# Altium schematic symbol library TI Power Management Shunt Voltage Reference.SchLib: 1526 symbols (part 4 of 18) (continued)
## LM4040C30QDBZTG4
designator U?
Precision Micropower Shunt Voltage Reference, 0.5% accuracy, 3 V, 15 ppm / degC, 15 mA, -40 to 125 degC, 3-pin SOT-23 (DBZ), Green (RoHS & no Sb/Br); Manufacturer: Texas Instruments; PartNumber: LM4040C30QDBZTG4; Initial Accuracy @ 25/deg C(%): 0.5; Iout/Iz(Max)(mA): 15; Min Iz for Regulation(uA): 60; Rating: Catalog; Temp Coeff(Max)(ppm/ degree C): 100; VO(V): 3; DatasheetVersion: SLOS456K; PackageVersion: 4203227/B; PackageReference: DBZ3; PackageDescription: 3-Pin Plastic Small Outline, Body 2.92 x 1.3 mm, Pitch 0.95 mm; Supplier 1: Digi-Key; Supplier Part Number 1: LM4040C30QDBZTG4-ND; Supplier 2: Mouser; Supplier Part Number 2: 595-LM4040C30QDBZTG4; Eco-Plan: Green (RoHS & no Sb/Br); SubFamily: Shunt Voltage Reference; Temp Coeff(Typ)(ppm/ degree C): 15; Mounting Technology: Surface Mount; Code_JEDEC: TO-236; ComponentLink1Description: Manufacturer URL; ComponentLink1URL: http://www.ti.com/; ComponentLink2Description: Datasheet; ComponentLink2URL: http://www.ti.com/general/docs/lit/getliterature.tsp?genericPartNumber=LM4040C30&fileType=pdf; ComponentLink3Description: Package Specification; ComponentLink3URL: http://www.ti.com/litv/pdf/mpds108a
footprint TI-DBZ3_N (SOT23, 3-Leads, Body 2.92x1.3 mm, Pitch 0.95 mm, IPC Medium Density)
pins: 1 CATHODE, 2 ANODE, 3 NC

## LM4040C41IDBZR
designator U?
Precision Micropower Shunt Voltage Reference, 0.5% accuracy, 4.096 V, 15 ppm / degC, 15 mA, -40 to 85 degC, 3-pin SOT-23 (DBZ), Green (RoHS & no Sb/Br); Manufacturer: Texas Instruments; PartNumber: LM4040C41IDBZR; Initial Accuracy @ 25/deg C(%): 0.5; Iout/Iz(Max)(mA): 15; Min Iz for Regulation(uA): 68; Rating: Catalog; Temp Coeff(Max)(ppm/ degree C): 100; VO(V): 4.096; DatasheetVersion: SLOS456K; PackageVersion: 4203227/B; PackageReference: DBZ3; PackageDescription: 3-Pin Plastic Small Outline, Body 2.92 x 1.3 mm, Pitch 0.95 mm; Supplier 1: Digi-Key; Supplier Part Number 1: 296-20890-2-ND; Supplier 2: Digi-Key; Supplier Part Number 2: 296-20890-1-ND; Supplier 3: Digi-Key; Supplier Part Number 3: 296-20890-6-ND; Supplier 4: Farnell; Supplier Part Number 4: 1575265; Supplier 5: Newark; Supplier Part Number 5: 66K2456; Supplier 6: Mouser; Supplier Part Number 6: 595-LM4040C41IDBZR; Eco-Plan: Green (RoHS & no Sb/Br); SubFamily: Shunt Voltage Reference; Temp Coeff(Typ)(ppm/ degree C): 15; Mounting Technology: Surface Mount; Code_JEDEC: TO-236; ComponentLink1Description: Manufacturer URL; ComponentLink1URL: http://www.ti.com/; ComponentLink2Description: Datasheet; ComponentLink2URL: http://www.ti.com/general/docs/lit/getliterature.tsp?genericPartNumber=LM4040C41&fileType=pdf; ComponentLink3Description: Package Specification; ComponentLink3URL: http://www.ti.com/litv/pdf/mpds108a
footprint TI-DBZ3_N (SOT23, 3-Leads, Body 2.92x1.3 mm, Pitch 0.95 mm, IPC Medium Density)
pins: 1 CATHODE, 2 ANODE, 3 NC "No internal connection"

## LM4040C41IDBZRG4
designator U?
Precision Micropower Shunt Voltage Reference, 0.5% accuracy, 4.096 V, 15 ppm / degC, 15 mA, -40 to 85 degC, 3-pin SOT-23 (DBZ), Green (RoHS & no Sb/Br); Manufacturer: Texas Instruments; PartNumber: LM4040C41IDBZRG4; Initial Accuracy @ 25/deg C(%): 0.5; Iout/Iz(Max)(mA): 15; Min Iz for Regulation(uA): 68; Rating: Catalog; Temp Coeff(Max)(ppm/ degree C): 100; VO(V): 4.096; DatasheetVersion: SLOS456K; PackageVersion: 4203227/B; PackageReference: DBZ3; PackageDescription: 3-Pin Plastic Small Outline, Body 2.92 x 1.3 mm, Pitch 0.95 mm; Supplier 1: Digi-Key; Supplier Part Number 1: LM4040C41IDBZRG4-ND; Supplier 2: Mouser; Supplier Part Number 2: 595-LM4040C41IDBZRG4; Eco-Plan: Green (RoHS & no Sb/Br); SubFamily: Shunt Voltage Reference; Temp Coeff(Typ)(ppm/ degree C): 15; Mounting Technology: Surface Mount; Code_JEDEC: TO-236; ComponentLink1Description: Manufacturer URL; ComponentLink1URL: http://www.ti.com/; ComponentLink2Description: Datasheet; ComponentLink2URL: http://www.ti.com/general/docs/lit/getliterature.tsp?genericPartNumber=LM4040C41&fileType=pdf; ComponentLink3Description: Package Specification; ComponentLink3URL: http://www.ti.com/litv/pdf/mpds108a
footprint TI-DBZ3_N (SOT23, 3-Leads, Body 2.92x1.3 mm, Pitch 0.95 mm, IPC Medium Density)
pins: 1 CATHODE, 2 ANODE, 3 NC "No internal connection"

## LM4040C41IDBZT
designator U?
Precision Micropower Shunt Voltage Reference, 0.5% accuracy, 4.096 V, 15 ppm / degC, 15 mA, -40 to 85 degC, 3-pin SOT-23 (DBZ), Green (RoHS & no Sb/Br); Manufacturer: Texas Instruments; PartNumber: LM4040C41IDBZT; Initial Accuracy @ 25/deg C(%): 0.5; Iout/Iz(Max)(mA): 15; Min Iz for Regulation(uA): 68; Rating: Catalog; Temp Coeff(Max)(ppm/ degree C): 100; VO(V): 4.096; DatasheetVersion: SLOS456K; PackageVersion: 4203227/B; PackageReference: DBZ3; PackageDescription: 3-Pin Plastic Small Outline, Body 2.92 x 1.3 mm, Pitch 0.95 mm; Supplier 1: Digi-Key; Supplier Part Number 1: 296-32117-2-ND; Supplier 2: Digi-Key; Supplier Part Number 2: 296-32117-1-ND; Supplier 3: Digi-Key; Supplier Part Number 3: 296-32117-6-ND; Supplier 4: Newark; Supplier Part Number 4: 66K2457; Supplier 5: Mouser; Supplier Part Number 5: 595-LM4040C41IDBZT; Eco-Plan: Green (RoHS & no Sb/Br); SubFamily: Shunt Voltage Reference; Temp Coeff(Typ)(ppm/ degree C): 15; Mounting Technology: Surface Mount; Code_JEDEC: TO-236; ComponentLink1Description: Manufacturer URL; ComponentLink1URL: http://www.ti.com/; ComponentLink2Description: Datasheet; ComponentLink2URL: http://www.ti.com/general/docs/lit/getliterature.tsp?genericPartNumber=LM4040C41&fileType=pdf; ComponentLink3Description: Package Specification; ComponentLink3URL: http://www.ti.com/litv/pdf/mpds108a
footprint TI-DBZ3_N (SOT23, 3-Leads, Body 2.92x1.3 mm, Pitch 0.95 mm, IPC Medium Density)
pins: 1 CATHODE, 2 ANODE, 3 NC "No internal connection"

## LM4040C41IDBZTG4
designator U?
Precision Micropower Shunt Voltage Reference, 0.5% accuracy, 4.096 V, 15 ppm / degC, 15 mA, -40 to 85 degC, 3-pin SOT-23 (DBZ), Green (RoHS & no Sb/Br); Manufacturer: Texas Instruments; PartNumber: LM4040C41IDBZTG4; Initial Accuracy @ 25/deg C(%): 0.5; Iout/Iz(Max)(mA): 15; Min Iz for Regulation(uA): 68; Rating: Catalog; Temp Coeff(Max)(ppm/ degree C): 100; VO(V): 4.096; DatasheetVersion: SLOS456K; PackageVersion: 4203227/B; PackageReference: DBZ3; PackageDescription: 3-Pin Plastic Small Outline, Body 2.92 x 1.3 mm, Pitch 0.95 mm; Supplier 1: Digi-Key; Supplier Part Number 1: LM4040C41IDBZTG4-ND; Supplier 2: Newark; Supplier Part Number 2: 67K8098; Supplier 3: Mouser; Supplier Part Number 3: 595-LM4040C41IDBZTG4; Eco-Plan: Green (RoHS & no Sb/Br); SubFamily: Shunt Voltage Reference; Temp Coeff(Typ)(ppm/ degree C): 15; Mounting Technology: Surface Mount; Code_JEDEC: TO-236; ComponentLink1Description: Manufacturer URL; ComponentLink1URL: http://www.ti.com/; ComponentLink2Description: Datasheet; ComponentLink2URL: http://www.ti.com/general/docs/lit/getliterature.tsp?genericPartNumber=LM4040C41&fileType=pdf; ComponentLink3Description: Package Specification; ComponentLink3URL: http://www.ti.com/litv/pdf/mpds108a
footprint TI-DBZ3_N (SOT23, 3-Leads, Body 2.92x1.3 mm, Pitch 0.95 mm, IPC Medium Density)
pins: 1 CATHODE, 2 ANODE, 3 NC "No internal connection"

## LM4040C41IDCKR
designator U?
Precision Micropower Shunt Voltage Reference, 0.5% accuracy, 4.096 V, 15 ppm / degC, 15 mA, -40 to 85 degC, 5-pin SC70 (DCK), Green (RoHS & no Sb/Br); Manufacturer: Texas Instruments; PartNumber: LM4040C41IDCKR; Initial Accuracy @ 25/deg C(%): 0.5; Iout/Iz(Max)(mA): 15; Min Iz for Regulation(uA): 68; Rating: Catalog; Temp Coeff(Max)(ppm/ degree C): 100; VO(V): 4.096; DatasheetVersion: SLOS456K; PackageReference: DCK5; PackageDescription: 5-Pin Plastic Small-Outline Package, 2 x 1.3 mm Body, 0.65 mm Pitch, 2.1 mm Lead Span; Supplier 1: Digi-Key; Supplier Part Number 1: 296-20891-2-ND; Supplier 2: Digi-Key; Supplier Part Number 2: 296-20891-1-ND; Supplier 3: Digi-Key; Supplier Part Number 3: 296-20891-6-ND; Supplier 4: Newark; Supplier Part Number 4: 66K2458; Supplier 5: Mouser; Supplier Part Number 5: 595-LM4040C41IDCKR; Eco-Plan: Green (RoHS & no Sb/Br); SubFamily: Shunt Voltage Reference; Temp Coeff(Typ)(ppm/ degree C): 15; Mounting Technology: Surface Mount; Code_JEDEC: MO-203; ComponentLink1Description: Manufacturer URL; ComponentLink1URL: http://www.ti.com/; ComponentLink2Description: Datasheet; ComponentLink2URL: http://www.ti.com/general/docs/lit/getliterature.tsp?genericPartNumber=LM4040C41&fileType=pdf; ComponentLink3Description: Package Specification; ComponentLink3URL: http://www.ti.com/litv/pdf/mpds025f
footprint TI-DCK5_N (SOT353, 5-Leads, Body 2x1.3mm, Pitch 0.65mm, Lead Span 2.1mm, IPC Medium Density)
part A pins: 1 ANODE, 3 CATHODE
part B pins: 2 NC, 4 NC, 5 NC

## LM4040C41IDCKRE4
designator U?
Precision Micropower Shunt Voltage Reference, 0.5% accuracy, 4.096 V, 15 ppm / degC, 15 mA, -40 to 85 degC, 5-pin SC70 (DCK), Green (RoHS & no Sb/Br); Manufacturer: Texas Instruments; PartNumber: LM4040C41IDCKRE4; Initial Accuracy @ 25/deg C(%): 0.5; Iout/Iz(Max)(mA): 15; Min Iz for Regulation(uA): 68; Rating: Catalog; Temp Coeff(Max)(ppm/ degree C): 100; VO(V): 4.096; DatasheetVersion: SLOS456K; PackageReference: DCK5; PackageDescription: 5-Pin Plastic Small-Outline Package, 2 x 1.3 mm Body, 0.65 mm Pitch, 2.1 mm Lead Span; Supplier 1: Digi-Key; Supplier Part Number 1: LM4040C41IDCKRE4-ND; Supplier 2: Mouser; Supplier Part Number 2: 595-LM4040C41IDCKRE4; Eco-Plan: Green (RoHS & no Sb/Br); SubFamily: Shunt Voltage Reference; Temp Coeff(Typ)(ppm/ degree C): 15; Mounting Technology: Surface Mount; Code_JEDEC: MO-203; ComponentLink1Description: Manufacturer URL; ComponentLink1URL: http://www.ti.com/; ComponentLink2Description: Datasheet; ComponentLink2URL: http://www.ti.com/general/docs/lit/getliterature.tsp?genericPartNumber=LM4040C41&fileType=pdf; ComponentLink3Description: Package Specification; ComponentLink3URL: http://www.ti.com/litv/pdf/mpds025f
footprint TI-DCK5_N (SOT353, 5-Leads, Body 2x1.3mm, Pitch 0.65mm, Lead Span 2.1mm, IPC Medium Density)
part A pins: 1 ANODE, 3 CATHODE
part B pins: 2 NC, 4 NC, 5 NC

## LM4040C41IDCKRG4
designator U?
Precision Micropower Shunt Voltage Reference, 0.5% accuracy, 4.096 V, 15 ppm / degC, 15 mA, -40 to 85 degC, 5-pin SC70 (DCK), Green (RoHS & no Sb/Br); Manufacturer: Texas Instruments; PartNumber: LM4040C41IDCKRG4; Initial Accuracy @ 25/deg C(%): 0.5; Iout/Iz(Max)(mA): 15; Min Iz for Regulation(uA): 68; Rating: Catalog; Temp Coeff(Max)(ppm/ degree C): 100; VO(V): 4.096; DatasheetVersion: SLOS456K; PackageReference: DCK5; PackageDescription: 5-Pin Plastic Small-Outline Package, 2 x 1.3 mm Body, 0.65 mm Pitch, 2.1 mm Lead Span; Supplier 1: Digi-Key; Supplier Part Number 1: LM4040C41IDCKRG4-ND; Supplier 2: Newark; Supplier Part Number 2: 41M3446; Supplier 3: Mouser; Supplier Part Number 3: 595-LM4040C41IDCKRG4; Eco-Plan: Green (RoHS & no Sb/Br); SubFamily: Shunt Voltage Reference; Temp Coeff(Typ)(ppm/ degree C): 15; Mounting Technology: Surface Mount; Code_JEDEC: MO-203; ComponentLink1Description: Manufacturer URL; ComponentLink1URL: http://www.ti.com/; ComponentLink2Description: Datasheet; ComponentLink2URL: http://www.ti.com/general/docs/lit/getliterature.tsp?genericPartNumber=LM4040C41&fileType=pdf; ComponentLink3Description: Package Specification; ComponentLink3URL: http://www.ti.com/litv/pdf/mpds025f
footprint TI-DCK5_N (SOT353, 5-Leads, Body 2x1.3mm, Pitch 0.65mm, Lead Span 2.1mm, IPC Medium Density)
part A pins: 1 ANODE, 3 CATHODE
part B pins: 2 NC, 4 NC, 5 NC

## LM4040C41ILP
designator U?
Precision Micropower Shunt Voltage Reference, 0.5% accuracy, 4.096 V, 15 ppm / degC, 15 mA, -40 to 85 degC, 3-pin TO-92 (LP), Pb-Free (RoHS); Manufacturer: Texas Instruments; PartNumber: LM4040C41ILP; Initial Accuracy @ 25/deg C(%): 0.5; Iout/Iz(Max)(mA): 15; Min Iz for Regulation(uA): 68; Rating: Catalog; Temp Coeff(Max)(ppm/ degree C): 100; VO(V): 4.096; DatasheetVersion: SLOS456K; PackageVersion: 4040001-2/C; PackageReference: LP3; PackageDescription: Plastic Cylindrical Package, Formed Lead Option (TO-92); Supplier 1: Digi-Key; Supplier Part Number 1: 296-31367-ND; Supplier 2: Farnell; Supplier Part Number 2: 1755114; Supplier 3: Newark; Supplier Part Number 3: 50M8848; Supplier 4: Mouser; Supplier Part Number 4: 595-LM4040C41ILP; Eco-Plan: Pb-Free (RoHS); SubFamily: Shunt Voltage Reference; Temp Coeff(Typ)(ppm/ degree C): 15; Mounting Technology: Through Hole; Code_JEDEC: TO-226; ComponentLink1Description: Manufacturer URL; ComponentLink1URL: http://www.ti.com/; ComponentLink2Description: Datasheet; ComponentLink2URL: http://www.ti.com/general/docs/lit/getliterature.tsp?genericPartNumber=LM4040C41&fileType=pdf; ComponentLink3Description: Package Specification; ComponentLink3URL: http://www.ti.com/litv/pdf/msot002a
footprint TI-LP3 (TO, Flat Index; 3 In-Line, Formed Axial Leads; Body Dia. 4.8mm; Leads 0.56 x 0.41 mm (max))
pins: 1 NC, 2 CATHODE, 3 ANODE

## LM4040C41ILPE3
designator U?
Precision Micropower Shunt Voltage Reference, 0.5% accuracy, 15 ppm / degC, 15 mA, -40 to 85 degC, 3-pin TO-92 (LP), Pb-Free (RoHS); Manufacturer: Texas Instruments; PartNumber: LM4040C41ILPE3; Initial Accuracy @ 25/deg C(%): 0.5; Iout/Iz(Max)(mA): 15; Min Iz for Regulation(uA): 68; Rating: Catalog; Temp Coeff(Max)(ppm/ degree C): 100; VO(V): 4.096; DatasheetVersion: SLOS456K; PackageVersion: 4040001-2/C; PackageReference: LP3; PackageDescription: Plastic Cylindrical Package, Formed Lead Option (TO-92); Supplier 1: Digi-Key; Supplier Part Number 1: LM4040C41ILPE3-ND; Supplier 2: Newark; Supplier Part Number 2: 65M1426; Supplier 3: Mouser; Supplier Part Number 3: 595-LM4040C41ILPE3; Eco-Plan: Pb-Free (RoHS); SubFamily: Shunt Voltage Reference; Temp Coeff(Typ)(ppm/ degree C): 15; Mounting Technology: Through Hole; Code_JEDEC: TO-226; ComponentLink1Description: Manufacturer URL; ComponentLink1URL: http://www.ti.com/; ComponentLink2Description: Datasheet; ComponentLink2URL: http://www.ti.com/general/docs/lit/getliterature.tsp?genericPartNumber=LM4040C41&fileType=pdf; ComponentLink3Description: Package Specification; ComponentLink3URL: http://www.ti.com/litv/pdf/msot002a
footprint TI-LP3 (TO, Flat Index; 3 In-Line, Formed Axial Leads; Body Dia. 4.8mm; Leads 0.56 x 0.41 mm (max))
pins: 1 NC, 2 CATHODE, 3 ANODE

## LM4040C41ILPR
designator U?
Precision Micropower Shunt Voltage Reference, 0.5% accuracy, 4.096 V, 15 ppm / degC, 15 mA, -40 to 85 degC, 3-pin TO-92 (LP), Pb-Free (RoHS); Manufacturer: Texas Instruments; PartNumber: LM4040C41ILPR; Initial Accuracy @ 25/deg C(%): 0.5; Iout/Iz(Max)(mA): 15; Min Iz for Regulation(uA): 68; Rating: Catalog; Temp Coeff(Max)(ppm/ degree C): 100; VO(V): 4.096; DatasheetVersion: SLOS456K; PackageVersion: 4040001-2/C; PackageReference: LP3; PackageDescription: Plastic Cylindrical Package, Formed Lead Option (TO-92); Supplier 1: Digi-Key; Supplier Part Number 1: 296-22165-3-ND; Supplier 2: Digi-Key; Supplier Part Number 2: 296-22165-1-ND; Supplier 3: Newark; Supplier Part Number 3: 50M8849; Supplier 4: Mouser; Supplier Part Number 4: 595-LM4040C41ILPR; Eco-Plan: Pb-Free (RoHS); SubFamily: Shunt Voltage Reference; Temp Coeff(Typ)(ppm/ degree C): 15; Mounting Technology: Through Hole; Code_JEDEC: TO-226; ComponentLink1Description: Manufacturer URL; ComponentLink1URL: http://www.ti.com/; ComponentLink2Description: Datasheet; ComponentLink2URL: http://www.ti.com/general/docs/lit/getliterature.tsp?genericPartNumber=LM4040C41&fileType=pdf; ComponentLink3Description: Package Specification; ComponentLink3URL: http://www.ti.com/litv/pdf/msot002a
footprint TI-LP3 (TO, Flat Index; 3 In-Line, Formed Axial Leads; Body Dia. 4.8mm; Leads 0.56 x 0.41 mm (max))
pins: 1 NC, 2 CATHODE, 3 ANODE

## LM4040C41ILPRE3
designator U?
Precision Micropower Shunt Voltage Reference, 0.5% accuracy, 4.096 V, 15 ppm / degC, 15 mA, -40 to 85 degC, 3-pin TO-92 (LP), Pb-Free (RoHS); Manufacturer: Texas Instruments; PartNumber: LM4040C41ILPRE3; Initial Accuracy @ 25/deg C(%): 0.5; Iout/Iz(Max)(mA): 15; Min Iz for Regulation(uA): 68; Rating: Catalog; Temp Coeff(Max)(ppm/ degree C): 100; VO(V): 4.096; DatasheetVersion: SLOS456K; PackageVersion: 4040001-2/C; PackageReference: LP3; PackageDescription: Plastic Cylindrical Package, Formed Lead Option (TO-92); Supplier 1: Digi-Key; Supplier Part Number 1: LM4040C41ILPRE3-ND; Supplier 2: Newark; Supplier Part Number 2: 65M1427; Supplier 3: Mouser; Supplier Part Number 3: 595-LM4040C41ILPRE3; Eco-Plan: Pb-Free (RoHS); SubFamily: Shunt Voltage Reference; Temp Coeff(Typ)(ppm/ degree C): 15; Mounting Technology: Through Hole; Code_JEDEC: TO-226; ComponentLink1Description: Manufacturer URL; ComponentLink1URL: http://www.ti.com/; ComponentLink2Description: Datasheet; ComponentLink2URL: http://www.ti.com/general/docs/lit/getliterature.tsp?genericPartNumber=LM4040C41&fileType=pdf; ComponentLink3Description: Package Specification; ComponentLink3URL: http://www.ti.com/litv/pdf/msot002a; ComponentLink4Description: URL Link1; ComponentLink4URL: Samples URL:http://www.ti.com/product/lm4040c41
footprint TI-LP3 (TO, Flat Index; 3 In-Line, Formed Axial Leads; Body Dia. 4.8mm; Leads 0.56 x 0.41 mm (max))
pins: 1 NC, 2 CATHODE, 3 ANODE

## LM4040C50IDBZR
designator U?
Precision Micropower Shunt Voltage Reference, 0.5% accuracy, 5 V, 15 ppm / degC, 15 mA, -40 to 85 degC, 3-pin SOT-23 (DBZ), Green (RoHS & no Sb/Br); Manufacturer: Texas Instruments; PartNumber: LM4040C50IDBZR; Initial Accuracy @ 25/deg C(%): 0.5; Iout/Iz(Max)(mA): 15; Min Iz for Regulation(uA): 74; Rating: Catalog; Temp Coeff(Max)(ppm/ degree C): 100; VO(V): 5; DatasheetVersion: SLOS456K; PackageVersion: 4203227/B; PackageReference: DBZ3; PackageDescription: 3-Pin Plastic Small Outline, Body 2.92 x 1.3 mm, Pitch 0.95 mm; Supplier 1: Digi-Key; Supplier Part Number 1: 296-20892-2-ND; Supplier 2: Digi-Key; Supplier Part Number 2: 296-20892-1-ND; Supplier 3: Digi-Key; Supplier Part Number 3: 296-20892-6-ND; Supplier 4: Farnell; Supplier Part Number 4: 2119188; Supplier 5: Newark; Supplier Part Number 5: 43K3362; Supplier 6: Mouser; Supplier Part Number 6: 595-LM4040C50IDBZR; Eco-Plan: Green (RoHS & no Sb/Br); SubFamily: Shunt Voltage Reference; Temp Coeff(Typ)(ppm/ degree C): 15; Mounting Technology: Surface Mount; Code_JEDEC: TO-236; ComponentLink1Description: Manufacturer URL; ComponentLink1URL: http://www.ti.com/; ComponentLink2Description: Datasheet; ComponentLink2URL: http://www.ti.com/general/docs/lit/getliterature.tsp?genericPartNumber=LM4040C50&fileType=pdf; ComponentLink3Description: Package Specification; ComponentLink3URL: http://www.ti.com/litv/pdf/mpds108a
footprint TI-DBZ3_N (SOT23, 3-Leads, Body 2.92x1.3 mm, Pitch 0.95 mm, IPC Medium Density)
pins: 1 CATHODE, 2 ANODE, 3 NC

## LM4040C50IDBZRG4
designator U?
Precision Micropower Shunt Voltage Reference, 0.5% accuracy, 5 V, 15 ppm / degC, 15 mA, -40 to 85 degC, 3-pin SOT-23 (DBZ), Green (RoHS & no Sb/Br); Manufacturer: Texas Instruments; PartNumber: LM4040C50IDBZRG4; Initial Accuracy @ 25/deg C(%): 0.5; Iout/Iz(Max)(mA): 15; Min Iz for Regulation(uA): 74; Rating: Catalog; Temp Coeff(Max)(ppm/ degree C): 100; VO(V): 5; DatasheetVersion: SLOS456K; PackageVersion: 4203227/B; PackageReference: DBZ3; PackageDescription: 3-Pin Plastic Small Outline, Body 2.92 x 1.3 mm, Pitch 0.95 mm; Supplier 1: Digi-Key; Supplier Part Number 1: LM4040C50IDBZRG4-ND; Supplier 2: Newark; Supplier Part Number 2: 52K5742; Supplier 3: Mouser; Supplier Part Number 3: 595-LM4040C50IDBZRG4; Eco-Plan: Green (RoHS & no Sb/Br); SubFamily: Shunt Voltage Reference; Temp Coeff(Typ)(ppm/ degree C): 15; Mounting Technology: Surface Mount; Code_JEDEC: TO-236; ComponentLink1Description: Manufacturer URL; ComponentLink1URL: http://www.ti.com/; ComponentLink2Description: Datasheet; ComponentLink2URL: http://www.ti.com/general/docs/lit/getliterature.tsp?genericPartNumber=LM4040C50&fileType=pdf; ComponentLink3Description: Package Specification; ComponentLink3URL: http://www.ti.com/litv/pdf/mpds108a
footprint TI-DBZ3_N (SOT23, 3-Leads, Body 2.92x1.3 mm, Pitch 0.95 mm, IPC Medium Density)
pins: 1 CATHODE, 2 ANODE, 3 NC

## LM4040C50IDBZT
designator U?
Precision Micropower Shunt Voltage Reference, 0.5% accuracy, 5 V, 15 ppm / degC, 15 mA, -40 to 85 degC, 3-pin SOT-23 (DBZ), Green (RoHS & no Sb/Br); Manufacturer: Texas Instruments; PartNumber: LM4040C50IDBZT; Initial Accuracy @ 25/deg C(%): 0.5; Iout/Iz(Max)(mA): 15; Min Iz for Regulation(uA): 74; Rating: Catalog; Temp Coeff(Max)(ppm/ degree C): 100; VO(V): 5; DatasheetVersion: SLOS456K; PackageVersion: 4203227/B; PackageReference: DBZ3; PackageDescription: 3-Pin Plastic Small Outline, Body 2.92 x 1.3 mm, Pitch 0.95 mm; Supplier 1: Digi-Key; Supplier Part Number 1: 296-27987-2-ND; Supplier 2: Digi-Key; Supplier Part Number 2: 296-27987-1-ND; Supplier 3: Digi-Key; Supplier Part Number 3: 296-27987-6-ND; Supplier 4: Newark; Supplier Part Number 4: 43K3363; Supplier 5: Mouser; Supplier Part Number 5: 595-LM4040C50IDBZT; Eco-Plan: Green (RoHS & no Sb/Br); SubFamily: Shunt Voltage Reference; Temp Coeff(Typ)(ppm/ degree C): 15; Mounting Technology: Surface Mount; Code_JEDEC: TO-236; ComponentLink1Description: Manufacturer URL; ComponentLink1URL: http://www.ti.com/; ComponentLink2Description: Datasheet; ComponentLink2URL: http://www.ti.com/general/docs/lit/getliterature.tsp?genericPartNumber=LM4040C50&fileType=pdf; ComponentLink3Description: Package Specification; ComponentLink3URL: http://www.ti.com/litv/pdf/mpds108a
footprint TI-DBZ3_N (SOT23, 3-Leads, Body 2.92x1.3 mm, Pitch 0.95 mm, IPC Medium Density)
pins: 1 CATHODE, 2 ANODE, 3 NC

## LM4040C50IDBZTG4
designator U?
Precision Micropower Shunt Voltage Reference, 0.5% accuracy, 5 V, 15 ppm / degC, 15 mA, -40 to 85 degC, 3-pin SOT-23 (DBZ), Green (RoHS & no Sb/Br); Manufacturer: Texas Instruments; PartNumber: LM4040C50IDBZTG4; Initial Accuracy @ 25/deg C(%): 0.5; Iout/Iz(Max)(mA): 15; Min Iz for Regulation(uA): 74; Rating: Catalog; Temp Coeff(Max)(ppm/ degree C): 100; VO(V): 5; DatasheetVersion: SLOS456K; PackageVersion: 4203227/B; PackageReference: DBZ3; PackageDescription: 3-Pin Plastic Small Outline, Body 2.92 x 1.3 mm, Pitch 0.95 mm; Supplier 1: Digi-Key; Supplier Part Number 1: LM4040C50IDBZTG4-ND; Supplier 2: Mouser; Supplier Part Number 2: 595-LM4040C50IDBZTG4; Eco-Plan: Green (RoHS & no Sb/Br); SubFamily: Shunt Voltage Reference; Temp Coeff(Typ)(ppm/ degree C): 15; Mounting Technology: Surface Mount; Code_JEDEC: TO-236; ComponentLink1Description: Manufacturer URL; ComponentLink1URL: http://www.ti.com/; ComponentLink2Description: Datasheet; ComponentLink2URL: http://www.ti.com/general/docs/lit/getliterature.tsp?genericPartNumber=LM4040C50&fileType=pdf; ComponentLink3Description: Package Specification; ComponentLink3URL: http://www.ti.com/litv/pdf/mpds108a
footprint TI-DBZ3_N (SOT23, 3-Leads, Body 2.92x1.3 mm, Pitch 0.95 mm, IPC Medium Density)
pins: 1 CATHODE, 2 ANODE, 3 NC

## LM4040C50IDCKR
designator U?
Precision Micropower Shunt Voltage Reference, 0.5% accuracy, 5 V, 15 ppm / degC, 15 mA, -40 to 85 degC, 5-pin SC70 (DCK), Green (RoHS & no Sb/Br); Manufacturer: Texas Instruments; PartNumber: LM4040C50IDCKR; Initial Accuracy @ 25/deg C(%): 0.5; Iout/Iz(Max)(mA): 15; Min Iz for Regulation(uA): 74; Rating: Catalog; Temp Coeff(Max)(ppm/ degree C): 100; VO(V): 5; DatasheetVersion: SLOS456K; PackageReference: DCK5; PackageDescription: 5-Pin Plastic Small-Outline Package, 2 x 1.3 mm Body, 0.65 mm Pitch, 2.1 mm Lead Span; Supplier 1: Digi-Key; Supplier Part Number 1: 296-20893-2-ND; Supplier 2: Digi-Key; Supplier Part Number 2: 296-20893-1-ND; Supplier 3: Digi-Key; Supplier Part Number 3: 296-20893-6-ND; Supplier 4: Newark; Supplier Part Number 4: 43K3364; Supplier 5: Mouser; Supplier Part Number 5: 595-LM4040C50IDCKR; Eco-Plan: Green (RoHS & no Sb/Br); SubFamily: Shunt Voltage Reference; Temp Coeff(Typ)(ppm/ degree C): 15; Mounting Technology: Surface Mount; Code_JEDEC: MO-203; ComponentLink1Description: Manufacturer URL; ComponentLink1URL: http://www.ti.com/; ComponentLink2Description: Datasheet; ComponentLink2URL: http://www.ti.com/general/docs/lit/getliterature.tsp?genericPartNumber=LM4040C50&fileType=pdf; ComponentLink3Description: Package Specification; ComponentLink3URL: http://www.ti.com/litv/pdf/mpds025f
footprint TI-DCK5_N (SOT353, 5-Leads, Body 2x1.3mm, Pitch 0.65mm, Lead Span 2.1mm, IPC Medium Density)
part A pins: 1 ANODE, 3 CATHODE
part B pins: 2 NC "No internal connection", 4 NC "No internal connection", 5 NC "No internal connection"

## LM4040C50IDCKRE4
designator U?
Precision Micropower Shunt Voltage Reference, 0.5% accuracy, 5 V, 15 ppm / degC, 15 mA, -40 to 85 degC, 5-pin SC70 (DCK), Green (RoHS & no Sb/Br); Manufacturer: Texas Instruments; PartNumber: LM4040C50IDCKRE4; Initial Accuracy @ 25/deg C(%): 0.5; Iout/Iz(Max)(mA): 15; Min Iz for Regulation(uA): 74; Rating: Catalog; Temp Coeff(Max)(ppm/ degree C): 100; VO(V): 5; DatasheetVersion: SLOS456K; PackageReference: DCK5; PackageDescription: 5-Pin Plastic Small-Outline Package, 2 x 1.3 mm Body, 0.65 mm Pitch, 2.1 mm Lead Span; Supplier 1: Digi-Key; Supplier Part Number 1: LM4040C50IDCKRE4-ND; Supplier 2: Mouser; Supplier Part Number 2: 595-LM4040C50IDCKRE4; Eco-Plan: Green (RoHS & no Sb/Br); SubFamily: Shunt Voltage Reference; Temp Coeff(Typ)(ppm/ degree C): 15; Mounting Technology: Surface Mount; Code_JEDEC: MO-203; ComponentLink1Description: Manufacturer URL; ComponentLink1URL: http://www.ti.com/; ComponentLink2Description: Datasheet; ComponentLink2URL: http://www.ti.com/general/docs/lit/getliterature.tsp?genericPartNumber=LM4040C50&fileType=pdf; ComponentLink3Description: Package Specification; ComponentLink3URL: http://www.ti.com/litv/pdf/mpds025f
footprint TI-DCK5_N (SOT353, 5-Leads, Body 2x1.3mm, Pitch 0.65mm, Lead Span 2.1mm, IPC Medium Density)
part A pins: 1 ANODE, 3 CATHODE
part B pins: 2 NC "No internal connection", 4 NC "No internal connection", 5 NC "No internal connection"

## LM4040C50IDCKRG4
designator U?
Precision Micropower Shunt Voltage Reference, 0.5% accuracy, 5 V, 15 ppm / degC, 15 mA, -40 to 85 degC, 5-pin SC70 (DCK), Green (RoHS & no Sb/Br); Manufacturer: Texas Instruments; PartNumber: LM4040C50IDCKRG4; Initial Accuracy @ 25/deg C(%): 0.5; Iout/Iz(Max)(mA): 15; Min Iz for Regulation(uA): 74; Rating: Catalog; Temp Coeff(Max)(ppm/ degree C): 100; VO(V): 5; DatasheetVersion: SLOS456K; PackageReference: DCK5; PackageDescription: 5-Pin Plastic Small-Outline Package, 2 x 1.3 mm Body, 0.65 mm Pitch, 2.1 mm Lead Span; Supplier 1: Digi-Key; Supplier Part Number 1: LM4040C50IDCKRG4-ND; Supplier 2: Newark; Supplier Part Number 2: 41M3447; Supplier 3: Mouser; Supplier Part Number 3: 595-LM4040C50IDCKRG4; Eco-Plan: Green (RoHS & no Sb/Br); SubFamily: Shunt Voltage Reference; Temp Coeff(Typ)(ppm/ degree C): 15; Mounting Technology: Surface Mount; Code_JEDEC: MO-203; ComponentLink1Description: Manufacturer URL; ComponentLink1URL: http://www.ti.com/; ComponentLink2Description: Datasheet; ComponentLink2URL: http://www.ti.com/general/docs/lit/getliterature.tsp?genericPartNumber=LM4040C50&fileType=pdf; ComponentLink3Description: Package Specification; ComponentLink3URL: http://www.ti.com/litv/pdf/mpds025f
footprint TI-DCK5_N (SOT353, 5-Leads, Body 2x1.3mm, Pitch 0.65mm, Lead Span 2.1mm, IPC Medium Density)
part A pins: 1 ANODE, 3 CATHODE
part B pins: 2 NC "No internal connection", 4 NC "No internal connection", 5 NC "No internal connection"

## LM4040C50ILP
designator U?
Precision Micropower Shunt Voltage Reference, 0.5% accuracy, 5 V, 15 ppm / degC, 15 mA, -40 to 85 degC, 3-pin TO-92 (LP), Pb-Free (RoHS); Manufacturer: Texas Instruments; PartNumber: LM4040C50ILP; Initial Accuracy @ 25/deg C(%): 0.5; Iout/Iz(Max)(mA): 15; Min Iz for Regulation(uA): 74; Rating: Catalog; Temp Coeff(Max)(ppm/ degree C): 100; VO(V): 5; DatasheetVersion: SLOS456K; PackageVersion: 4040001-2/C; PackageReference: LP3; PackageDescription: Plastic Cylindrical Package, Formed Lead Option (TO-92); Supplier 1: Digi-Key; Supplier Part Number 1: 296-31368-ND; Supplier 2: Newark; Supplier Part Number 2: 33M9283; Supplier 3: Mouser; Supplier Part Number 3: 595-LM4040C50ILP; Eco-Plan: Pb-Free (RoHS); SubFamily: Shunt Voltage Reference; Temp Coeff(Typ)(ppm/ degree C): 15; Mounting Technology: Through Hole; Code_JEDEC: TO-226; ComponentLink1Description: Manufacturer URL; ComponentLink1URL: http://www.ti.com/; ComponentLink2Description: Datasheet; ComponentLink2URL: http://www.ti.com/general/docs/lit/getliterature.tsp?genericPartNumber=LM4040C50&fileType=pdf; ComponentLink3Description: Package Specification; ComponentLink3URL: http://www.ti.com/litv/pdf/msot002a; ComponentLink4Description: URL Link1; ComponentLink4URL: Samples URL:http://www.ti.com/product/lm4040c50
footprint TI-LP3 (TO, Flat Index; 3 In-Line, Formed Axial Leads; Body Dia. 4.8mm; Leads 0.56 x 0.41 mm (max))
pins: 1 NC, 2 CATHODE, 3 ANODE

## LM4040C50ILPE3
designator U?
Precision Micropower Shunt Voltage Reference, 0.5% accuracy, 5 V, 15 ppm / degC, 15 mA, -40 to 85 degC, 3-pin TO-92 (LP), Pb-Free (RoHS); Manufacturer: Texas Instruments; PartNumber: LM4040C50ILPE3; Initial Accuracy @ 25/deg C(%): 0.5; Iout/Iz(Max)(mA): 15; Min Iz for Regulation(uA): 74; Rating: Catalog; Temp Coeff(Max)(ppm/ degree C): 100; VO(V): 5; DatasheetVersion: SLOS456K; PackageVersion: 4040001-2/C; PackageReference: LP3; PackageDescription: Plastic Cylindrical Package, Formed Lead Option (TO-92); Supplier 1: Digi-Key; Supplier Part Number 1: LM4040C50ILPE3-ND; Supplier 2: Newark; Supplier Part Number 2: 65M1428; Supplier 3: Mouser; Supplier Part Number 3: 595-LM4040C50ILPE3; Eco-Plan: Pb-Free (RoHS); SubFamily: Shunt Voltage Reference; Temp Coeff(Typ)(ppm/ degree C): 15; Mounting Technology: Through Hole; Code_JEDEC: TO-226; ComponentLink1Description: Manufacturer URL; ComponentLink1URL: http://www.ti.com/; ComponentLink2Description: Datasheet; ComponentLink2URL: http://www.ti.com/general/docs/lit/getliterature.tsp?genericPartNumber=LM4040C50&fileType=pdf; ComponentLink3Description: Package Specification; ComponentLink3URL: http://www.ti.com/litv/pdf/msot002a; ComponentLink4Description: URL Link1; ComponentLink4URL: Samples URL:http://www.ti.com/product/lm4040c50
footprint TI-LP3 (TO, Flat Index; 3 In-Line, Formed Axial Leads; Body Dia. 4.8mm; Leads 0.56 x 0.41 mm (max))
pins: 1 NC, 2 CATHODE, 3 ANODE

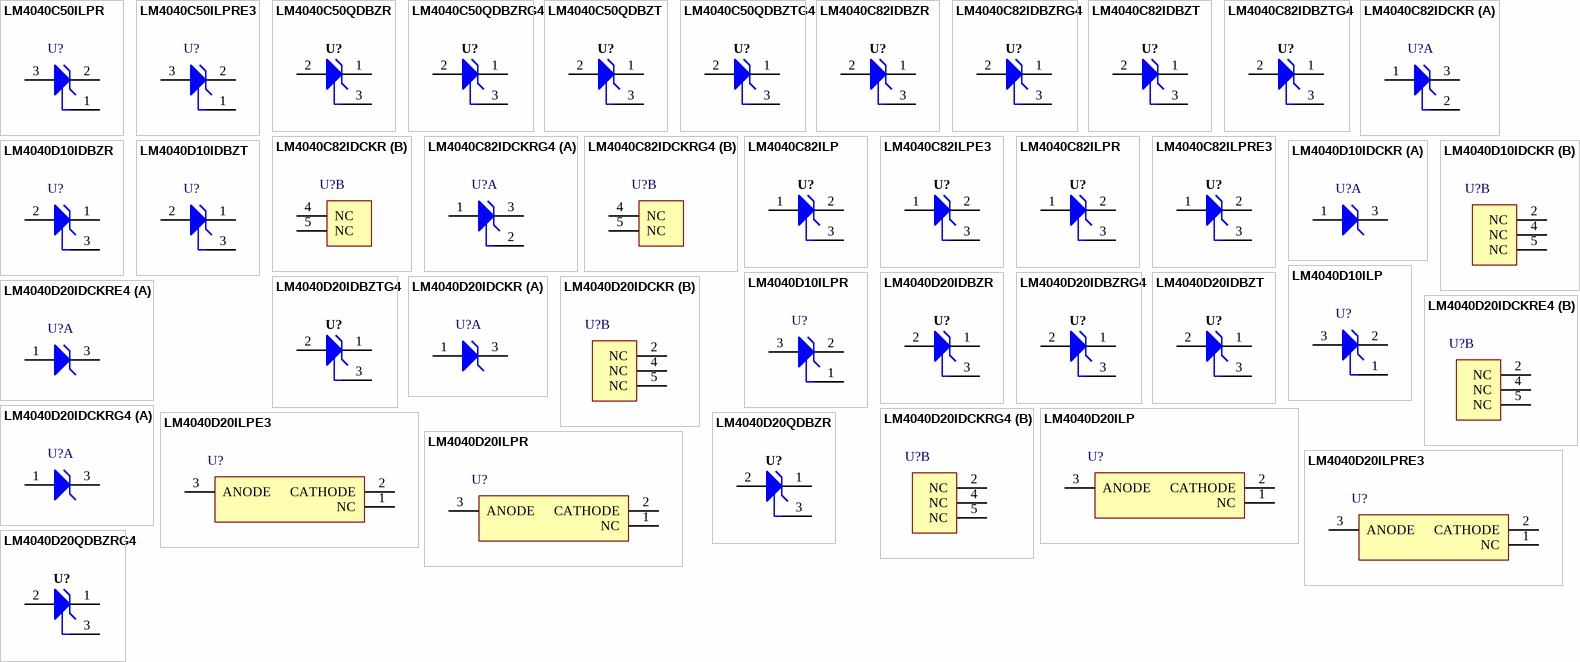
[diagram p11: symbols LM4040C50ILPR to LM4040D20QDBZRG4]
